# Altium footprint library d1_PcbLib.PcbLib: 266 footprints (part 3 of 17)
Each footprint in its own frame and in the unit in brackets; x right, y up, seen from the top. Pads: shape width x height; smd on the part's side, far side on the other; paste and mask are expansions set on the pad; w line width, h text height; cw(c..) or ccw(c..) is an arc to the next point about the centre after c.
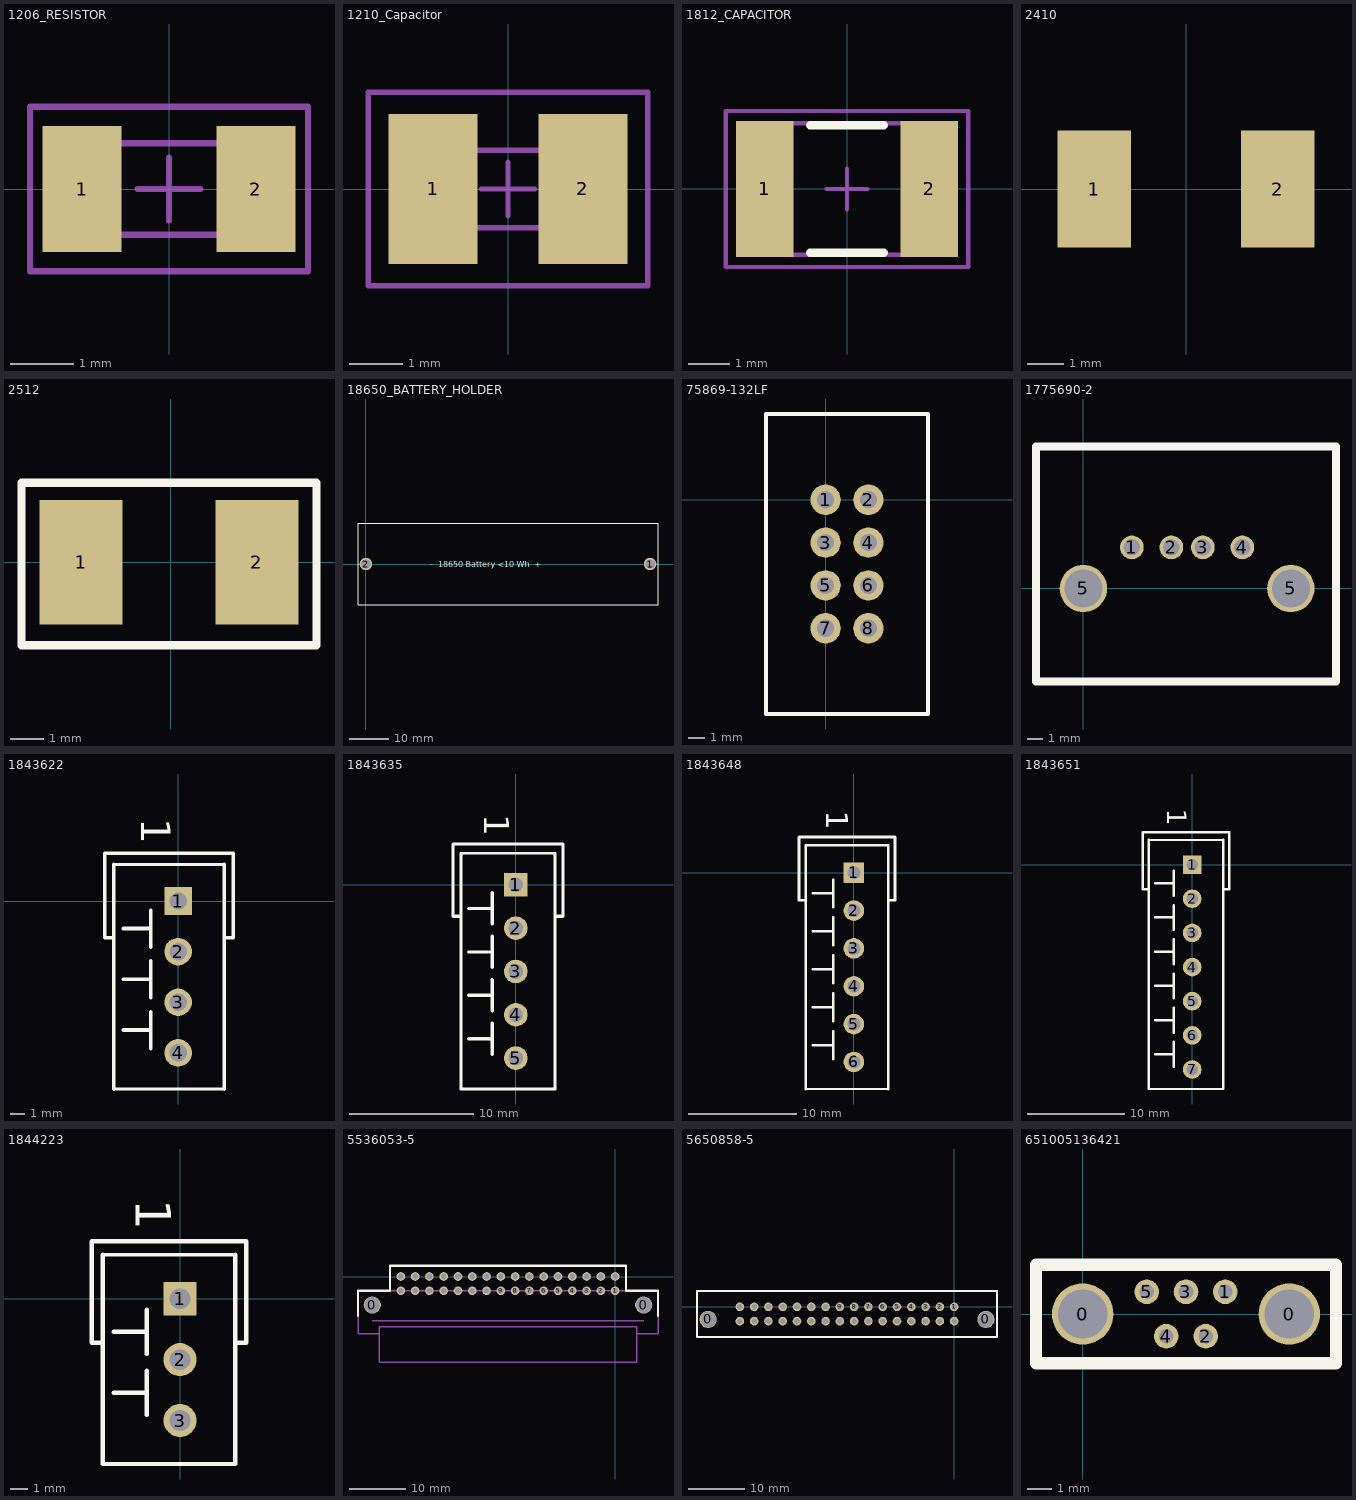
[diagram p2: the footprints below, top view; thin cyan lines are the x and y axes]

## 1206_RESISTOR [mm] "1206 Resistor/Capacitor"
height 1.1
pads (2):
  rect 1.25x2 smd: 1(-1.375,0) 2(1.375,0)
Mechanical 13:
  lines w0.1: -1.1,-0.725 1.1,-0.725 1.1,0.725 -1.1,0.725 -1.1,-0.725
Mechanical 15:
  lines w0.1: -0.5,0 0.5,0 ; 0,-0.5 0,0.5 ; -2.2,-1.3 2.2,-1.3 2.2,1.3 -2.2,1.3 -2.2,-1.3
3D body: height 1, standoff 0, extent -1.6,-0.8 1.6,0.8

## 1210_Capacitor [mil] "1210 Capacitor"
height 43.31
pads (2):
  rect 65x110 smd: 1(-55,0) 2(55,0)
Mechanical 13:
  lines w3.94: -43.31,-28.54 43.31,-28.54 43.31,28.54 -43.31,28.54 -43.31,-28.54
Mechanical 15:
  lines w3.94: -19.68,0 19.69,0 ; 0,-19.68 0,19.69 ; -102.36,-70.87 102.36,-70.87 102.36,70.87 -102.36,70.87 -102.36,-70.87
3D body: height 36.4, standoff -1.39, extent -83.78,-54.39 81.57,51.9

## 1812_CAPACITOR [mm] "Chip Capacitor, 2-Leads, Body 4.5x3.2mm, IPC Medium Density"
height 2.5
pads (2):
  rect 1.4x3.3 smd: 1(-2,0) 2(2,0)
Top Overlay:
  lines w0.2: -0.9,-1.55 0.9,-1.55 ; -0.9,1.55 0.9,1.55
Mechanical 13:
  lines w0.1: -2.25,-1.6 2.25,-1.6 2.25,1.6 -2.25,1.6 -2.25,-1.6
Mechanical 15:
  lines w0.1: -0.5,0 0.5,0 ; 0,-0.5 0,0.5 ; -2.95,-1.9 2.95,-1.9 2.95,1.9 -2.95,1.9 -2.95,-1.9
3D body: height 2.5, standoff 0, extent -2.25,-1.6 2.25,1.6

## 2410 [mm]
pads (2):
  rect 2x3.18 smd: 1(-2.5,0) 2(2.5,0)

## 2512 [mm]
pads (2):
  rect 2.5x3.75 smd: 1(-2.7,0) 2(2.6,0)
Top Overlay:
  lines w0.254: -4.5,-2.5 -4.5,2.4 4.4,2.4 4.4,-2.5 -4.5,-2.5
3D body: height 0.6, standoff 0, extent -3.175,-1.575 3.175,1.575

## 18650_BATTERY_HOLDER [mm]
pads (2):
  round 3.2 hole 2.4: 1(72.9,0) 2(0,0)
Top Overlay:
  lines w0.254: -2.03,-10.5 74.93,-10.5 74.93,10.5 -2.03,10.5 -2.03,-10.5
  text "-  18650 Battery <10 Wh  +" at 16.485,-0.889 h1.52

## 75869-132LF [mm]
pads (8):
  round 1.8 hole 1.02: 1(0,0) 2(2.54,0) 3(0,-2.54) 4(2.54,-2.54) 5(0,-5.08) 6(2.54,-5.08) 7(0,-7.62) 8(2.54,-7.62)
Top Overlay:
  lines w0.254: -3.53,-12.7 6.07,-12.7 6.07,5.08 -3.53,5.08 -3.53,-12.7
Mechanical 13:
  lines w0.254: -3.53,-12.7 -3.53,5.08 6.07,5.08 6.07,-12.7 -3.53,-12.7
3D body: height 9.6, standoff 0, extent -3.529,-12.7 6.069,5.08

## 1775690-2 [mm] "TC USB A RECPT VERT MOUNT"
pads (6):
  round 1.5 hole 1.05: 1(3.07,2.6) 2(5.57,2.6) 3(7.57,2.6) 4(10.07,2.6)
  round 3 hole 2.4: 5(0,0) 5(13.14,0)
Top Overlay:
  lines w0.508: -3,-5.9 16,-5.9 16,9 -3,9 -3,-5.9
3D body: height 15, standoff -3.5, extent -2.949,-5.91 16.15,8.71

## 1843622 [mil]
pads (4):
  rect 75x75 hole 47: 1(0,0)
  round 75 hole 47: 2(0,-137.8) 3(0,-275.59) 4(0,-413.39)
Top Overlay:
  lines w8: -175,-511.81 125,-511.81 ; -175,100 125,100
  lines w10: -175,-511.81 -175,100 ; -175,-100 -200,-100 -200,130 150,130 150,-100 130,-100 ; -150,-351.38 -75,-351.38 ; -150,-213.19 -75,-213.19 ; -150,-75 -75,-75 ; -75,-401.38 -75,-301.38 ; -75,-263.19 -75,-163.19 ; -75,-125 -75,-25 ; 125,-511.81 125,100
  text "1" at -100,225 h80

## 1843635 [mil]
pads (5):
  rect 75x75 hole 47: 1(0,0)
  round 75 hole 47: 2(0,-137.8) 3(0,-275.59) 4(0,-413.39) 5(0,-551.18)
Top Overlay:
  lines w8: -175,-649.61 125,-649.61 ; -175,100 125,100
  lines w10: -175,-649.61 -175,100 ; -175,-100 -200,-100 -200,130 150,130 150,-100 130,-100 ; -150,-489.57 -75,-489.57 ; -150,-351.38 -75,-351.38 ; -150,-213.19 -75,-213.19 ; -150,-75 -75,-75 ; -75,-539.57 -75,-439.57 ; -75,-401.38 -75,-301.38 ; -75,-263.19 -75,-163.19 ; -75,-125 -75,-25 ; 125,-649.61 125,100
  text "1" at -100,225 h80

## 1843648 [mil]
pads (6):
  rect 75x75 hole 47: 1(0,0)
  round 75 hole 47: 2(0,-137.8) 3(0,-275.59) 4(0,-413.39) 5(0,-551.18) 6(0,-688.98)
Top Overlay:
  lines w8: -175,-787.4 125,-787.4 ; -175,100 125,100
  lines w10: -175,-787.4 -175,100 ; -175,-100 -200,-100 -200,130 150,130 150,-100 130,-100 ; -150,-627.76 -75,-627.76 ; -150,-489.57 -75,-489.57 ; -150,-351.38 -75,-351.38 ; -150,-213.19 -75,-213.19 ; -150,-75 -75,-75 ; -75,-677.76 -75,-577.76 ; -75,-539.57 -75,-439.57 ; -75,-401.38 -75,-301.38 ; -75,-263.19 -75,-163.19 ; -75,-125 -75,-25 ; 125,-787.4 125,100
  text "1" at -100,225 h80

## 1843651 [mil]
pads (7):
  rect 75x75 hole 47: 1(0,0)
  round 75 hole 47: 2(0,-137.8) 3(0,-275.59) 4(0,-413.39) 5(0,-551.18) 6(0,-688.98) 7(0,-826.77)
Top Overlay:
  lines w8: -175,-905.51 125,-905.51 ; -175,100 125,100
  lines w10: -175,-905.51 -175,100 ; -175,-100 -200,-100 -200,130 150,130 150,-100 130,-100 ; -150,-765.55 -75,-765.55 ; -150,-627.76 -75,-627.76 ; -150,-489.57 -75,-489.57 ; -150,-351.38 -75,-351.38 ; -150,-213.19 -75,-213.19 ; -150,-75 -75,-75 ; -75,-815.55 -75,-715.55 ; -75,-677.76 -75,-577.76 ; -75,-539.57 -75,-439.57 ; -75,-401.38 -75,-301.38 ; -75,-263.19 -75,-163.19 ; -75,-125 -75,-25 ; 125,-905.51 125,100
  text "1" at -100,225 h80

## 1844223 [mil]
pads (3):
  rect 75x75 hole 47: 1(0,0)
  round 75 hole 47: 2(0,-137.8) 3(0,-275.59)
Top Overlay:
  lines w8: -175,-374.02 125,-374.02 ; -175,100 125,100
  lines w10: -175,-374.02 -175,100 ; -175,-100 -200,-100 -200,130 150,130 150,-100 130,-100 ; -150,-213.19 -75,-213.19 ; -150,-75 -75,-75 ; -75,-263.19 -75,-163.19 ; -75,-125 -75,-25 ; 125,-374.02 125,100
  text "1" at -100,225 h80

## 5536053-5 [mil]
pads (34):
  round 120 hole 110: 0(-1700,-200) 0(200,-200)
  round 60 hole 40: 1(0,-100) 2(-100,-100) 3(-200,-100) 4(-300,-100) 5(-400,-100) 6(-500,-100) 7(-600,-100) 8(-700,-100) 9(-800,-100) 10(-900,-100) 11(-1000,-100) 12(-1100,-100) 13(-1200,-100) 14(-1300,-100) 15(-1400,-100) 16(-1500,-100) 17(0,0) 18(-100,0) 19(-200,0) 20(-300,0) 21(-400,0) 22(-500,0) 23(-600,0) 24(-700,0) 25(-800,0) 26(-900,0) 27(-1000,0) 28(-1100,0) 29(-1200,0) 30(-1300,0) 31(-1400,0) 32(-1500,0)
Top Overlay:
  lines w15: -1800,-275 -1800,-100 -1575,-100 -1575,75 75,75 75,-100 300,-100 300,-275
Mechanical 1:
  lines w10: -1700,-310 200,-310 ; -1650.02,-399.98 -1799.98,-399.98 -1800,-100 300,-100 300,-400 150.02,-399.98 ; -1650,-600 150,-600 150,-350 -1650,-350 -1650,-600
3D body: height 230, standoff 0, extent -1799.98,-399.98 299.98,-100.02
3D body: height 300, standoff -50, extent -1649.98,-599.98 149.98,-350.02

## 5650858-5 [mil]
pads (34):
  round 120 hole 110: 0(-1722,-88) 0(222,-88)
  round 60 hole 40: 1(0,0) 2(-100,0) 3(-200,0) 4(-300,0) 5(-400,0) 6(-500,0) 7(-600,0) 8(-700,0) 9(-800,0) 10(-900,0) 11(-1000,0) 12(-1100,0) 13(-1200,0) 14(-1300,0) 15(-1400,0) 16(-1500,0) 17(0,-100) 18(-100,-100) 19(-200,-100) 20(-300,-100) 21(-400,-100) 22(-500,-100) 23(-600,-100) 24(-700,-100) 25(-800,-100) 26(-900,-100) 27(-1000,-100) 28(-1100,-100) 29(-1200,-100) 30(-1300,-100) 31(-1400,-100) 32(-1500,-100)
Top Overlay:
  lines w15: -1800,-210 300,-210 300,110 -1800,110 -1800,-210
Mechanical 1:
  lines w10: -1800,-210 -1800,110 300,110 300,-210 -1800,-210
3D body: height 450, standoff 0, extent -1805,-215 305,115

## 651005136421 [mm] "MINI USB VERT THROUGH HOLE"
pads (7):
  round 2.5 hole 2: 0(0,0) 0(8.4,0)
  round 1 hole 0.6: 1(5.8,0.9) 2(5,-0.9) 3(4.2,0.9) 4(3.4,-0.9) 5(2.6,0.9)
Top Overlay:
  lines w0.508: -1.9,-2 10.3,-2 10.3,2 -1.9,2 -1.9,-2
3D body: height 9.2, standoff -2.8, extent -0.923,-1.98 9.274,1.98